# Altium footprint library Generic Module.PcbLib: 8 footprints
Each footprint in its own frame and in the unit in brackets; x right, y up, seen from the top. Pads: shape width x height; smd on the part's side, far side on the other; paste and mask are expansions set on the pad; w line width, h text height; cw(c..) or ccw(c..) is an arc to the next point about the centre after c.
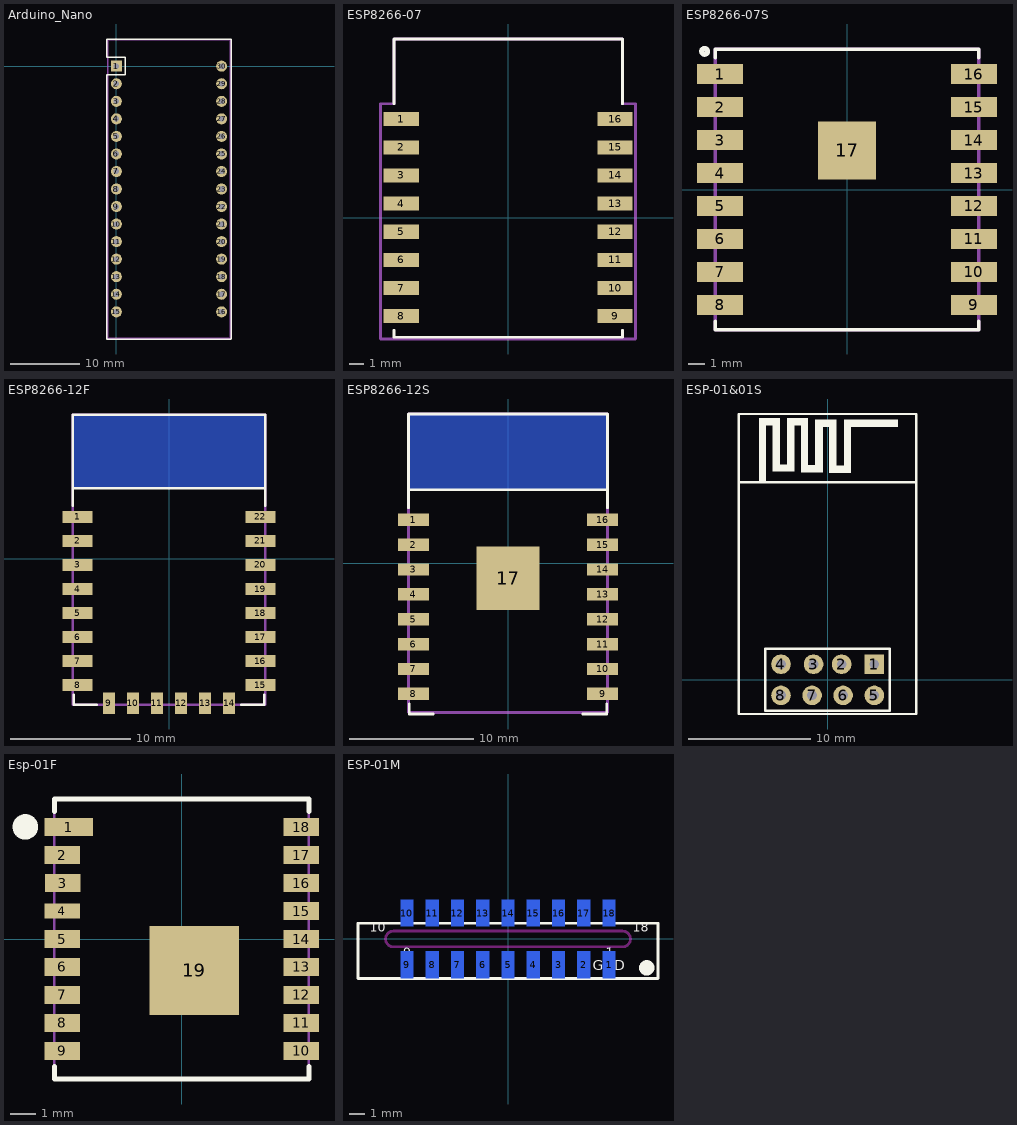
[diagram p0: the footprints below, top view; thin cyan lines are the x and y axes]

## Arduino_Nano [mm]
pads (30):
  rect 1.6x1.6 hole 0.8: 1(0,0)
  round 1.6 hole 0.8: 2(0,-2.54) 3(0,-5.08) 4(0,-7.62) 5(0,-10.16) 6(0,-12.7) 7(0,-15.24) 8(0,-17.78) 9(0,-20.32) 10(0,-22.86) 11(0,-25.4) 12(0,-27.94) 13(0,-30.48) 14(0,-33.02) 15(0,-35.56) 16(15.24,-35.56) 17(15.24,-33.02) 18(15.24,-30.48) 19(15.24,-27.94) 20(15.24,-25.4) 21(15.24,-22.86) 22(15.24,-20.32) 23(15.24,-17.78) 24(15.24,-15.24) 25(15.24,-12.7) 26(15.24,-10.16) 27(15.24,-7.62) 28(15.24,-5.08) 29(15.24,-2.54) 30(15.24,0)
Top Overlay:
  lines w0.2: -1.4,-39.5 -1.4,-1.27 1.27,-1.27 1.27,1.27 -1.4,1.27 -1.4,3.94 16.64,3.94 16.64,-39.5 -1.4,-39.5
Top Assembly:
  lines w0.2: -1.27,-39.37 16.51,-39.37 16.51,3.81 -1.27,3.81 -1.27,-39.37

## ESP8266-07 [mm]
pads (16):
  rect 2.5x1 smd: 1(-7.6,7) 2(-7.6,5) 3(-7.6,3) 4(-7.6,1) 5(-7.6,-1) 6(-7.6,-3) 7(-7.6,-5) 8(-7.6,-7) 9(7.6,-7) 10(7.6,-5) 11(7.6,-3) 12(7.6,-1) 13(7.6,1) 14(7.6,3) 15(7.6,5) 16(7.6,7)
Top Overlay:
  lines w0.203: -8.12,-8.001 -8.12,-8.5 8.12,-8.5 8.12,-8.001 ; -8.12,8.1 -8.12,12.7 8.12,12.7 8.12,8.1
Top Assembly:
  lines w0.203: -9.062,-8.62 -9.062,8.1 -8.12,8.1 -8.12,12.7 8.12,12.7 8.12,8.1 9.03,8.1 9.036,8.094 9.036,-8.62 -9.036,-8.62 -9.062,-8.593
Multi-Layer:
  pour cut-out: -8.128,12.641 -8.128,8.069 8.128,8.069 8.128,12.641
3D body "ESP8266-07.step": height 3.5, standoff -0.01, extent -7.96,-8.725 8.04,13.275

## ESP8266-07S [mm]
pads (17):
  rect 2.8x1.2 smd: 1(-7.7,7) 2(-7.7,5) 3(-7.7,3) 4(-7.7,1) 5(-7.7,-1) 6(-7.7,-3) 7(-7.7,-5) 8(-7.7,-7) 9(7.7,-7) 10(7.7,-5) 11(7.7,-3) 12(7.7,-1) 13(7.7,1) 14(7.7,3) 15(7.7,5) 16(7.7,7)
  rect 3.5x3.5 smd: 17(0,2.37)
Top Overlay:
  circle w0.3: c-8.636,8.382 r0.18
  lines w0.2: -8.001,8.001 -8.001,8.5 -8,8.5 8,8.5 ; -8,-8.5 8,-8.5 ; -7.999,-8.5 -7.999,-8.001 ; 7.999,8.001 7.999,8.5 ; 8.001,-8.5 8.001,-8.001
Top Assembly:
  lines w0.2: -8,-8.5 -8,8.5 8,8.5 8,-8.5 -8,-8.5
3D body: height 0.25, standoff 0, extent -8.001,-8.509 8.001,8.509

## ESP8266-12F [mm]
pads (22):
  rect 2.5x1 smd: 1(-7.6,3.5) 2(-7.6,1.5) 3(-7.6,-0.5) 4(-7.6,-2.5) 5(-7.6,-4.5) 6(-7.6,-6.5) 7(-7.6,-8.5) 8(-7.6,-10.5) 15(7.6,-10.5) 16(7.6,-8.5) 17(7.6,-6.5) 18(7.6,-4.5) 19(7.6,-2.5) 20(7.6,-0.5) 21(7.6,1.5) 22(7.6,3.5)
  rect 1x1.8 smd: 9(-5,-12) 10(-3,-12) 11(-1,-12) 12(1,-12) 13(3,-12) 14(5,-12)
Bottom Layer:
  pour cut-out: 8.001,12.065 8.001,5.842 -8.001,5.842 -8.001,12.065
Top Overlay:
  lines w0.2: -8.001,5.9 8.001,5.9
  lines w0.203: -8,4.445 -8,12 8,12 8,4.445 ; -7.925,-11.278 -7.925,-12.12 -6,-12.12 ; 6,-12.12 7.925,-12.12 7.925,-11.278
Top Assembly:
  lines w0.203: -8,-12.12 8,-12.12 8,12 -8,12 -8,-12.12
Multi-Layer:
  pour cut-out: 8.001,5.842 -8.001,5.842 -8.001,12.065 8.001,12.065
3D body "EPS8266-12E.step": height 2.65, standoff -0.04, extent -8.005,-12.065 8.005,11.94

## ESP8266-12S [mm]
pads (17):
  rect 2.5x1 smd: 1(-7.6,3.5) 2(-7.6,1.5) 3(-7.6,-0.5) 4(-7.6,-2.5) 5(-7.6,-4.5) 6(-7.6,-6.5) 7(-7.6,-8.5) 8(-7.6,-10.5) 9(7.6,-10.5) 10(7.6,-8.5) 11(7.6,-6.5) 12(7.6,-4.5) 13(7.6,-2.5) 14(7.6,-0.5) 15(7.6,1.5) 16(7.6,3.5)
  rect 5.08x5.08 smd: 17(0,-1.2)
Bottom Layer:
  pour cut-out: 8.001,11.938 8.001,5.842 -8.001,5.842 -8.001,11.938
  pour cut-out: -8.001,11.938
Top Overlay:
  lines w0.2: -8,5.9 8,5.9
  lines w0.203: -8,4.445 -8,12 8,12 8,4.445 ; -7.925,-11.278 -7.925,-12.12 -6,-12.12 ; 6,-12.12 7.925,-12.12 7.925,-11.278
Top Assembly:
  lines w0.203: -8,-12 8,-12 8,12 -8,12 -8,-12
Multi-Layer:
  pour cut-out: -8,12 -8,5.9 8,5.9 8,12
3D body "ESP-12S.step": height 2.35, standoff -0.77, extent -8,-12.06 8,11.94

## ESP-01&01S [mm]
pads (8):
  rect 1.6x1.6 hole 0.8: 1(3.81,1.27)
  round 1.6 hole 0.8: 2(1.15,1.27) 3(-1.15,1.27) 4(-3.81,1.27) 5(3.81,-1.27) 6(1.27,-1.27) 7(-1.27,-1.27) 8(-3.81,-1.27)
Top Overlay:
  rectangle: -5.599,16.129 -5.015,21.361
  rectangle: -5.015,20.777 -3.897,21.361
  rectangle: -4.507,17.018 -3.897,20.777
  rectangle: -3.897,17.018 -2.703,17.602
  rectangle: -3.313,17.602 -2.703,21.361
  rectangle: -2.703,20.777 -1.586,21.361
  rectangle: -2.17,16.942 -1.586,20.777
  rectangle: -1.586,16.942 -0.392,17.526
  rectangle: -1.027,17.526 -0.392,21.26
  rectangle: -0.392,20.65 0.726,21.26
  rectangle: 0.116,16.891 0.726,20.65
  rectangle: 0.726,16.891 1.919,17.501
  rectangle: 1.335,17.501 1.919,21.26
  rectangle: 1.919,20.65 5.755,21.26
  lines w0.2: -7.25,16.129 7.25,16.129 ; -7.25,-2.794 7.25,-2.794 7.25,21.706 -7.25,21.706 -7.25,-2.794 ; -5.08,-2.54 -5.08,2.54 5.08,2.54 5.08,-2.54 -5.08,-2.54
3D body "ESP-01.step": height 5.88, standoff -5.8, extent -7.239,-2.794 7.261,22.006

## Esp-01F [mm]
pads (19):
  rect 1.9x0.7 smd: 1(-4.441,4.4)
  rect 1.4x0.7 smd: 2(-4.695,3.3) 3(-4.67,2.2) 5(-4.695,0) 6(-4.695,-1.1) 7(-4.695,-2.2) 8(-4.695,-3.3) 9(-4.695,-4.4) 10(4.695,-4.4) 11(4.695,-3.3) 12(4.695,-2.2) 13(4.695,-1.1) 14(4.695,0) 15(4.695,1.1) 16(4.695,2.2) 17(4.695,3.3) 18(4.695,4.4)
  rect 1.4x0.6 smd: 4(-4.695,1.1)
  rect 3.5x3.5 smd: 19(0.493,-1.233)
Top Overlay:
  circle w0.5: c-6.143,4.406 r0.25
  lines w0.2: -5,-5.008 -5,-5.5 5,-5.5 5,-5.008 ; -5,5.008 -5,5.5 5,5.5 5,5.008
Mechanical 15:
  lines w0.1: -5,-5.5 5,-5.5 5,5.5 -5,5.5 -5,-5.5
3D body: height 0.25, standoff 0, extent -5.062,-5.588 5.08,5.589

## ESP-01M [mm]
pads (18):
  rect 0.8x1.7 smd far side: 1(6.4,-1.643) 2(4.8,-1.643) 3(3.2,-1.643) 4(1.6,-1.643) 5(0,-1.643) 6(-1.6,-1.643) 7(-3.2,-1.643) 8(-4.8,-1.643) 9(-6.4,-1.643) 10(-6.4,1.643) 11(-4.8,1.643) 12(-3.2,1.643) 13(-1.6,1.643) 14(0,1.643) 15(1.6,1.643) 16(3.2,1.643) 17(4.8,1.643) 18(6.4,1.643)
Top Overlay:
  circle w0.5: c8.788,-1.829 r0.234
  lines w0.178: -9.5,-2.5 -9.5,1 9.5,1 9.5,-2.5 -9.5,-2.5
  text "18" at 7.899,0.229 h1
  text "10" at -8.763,0.229 h1
  text "9" at -6.629,-1.346 h1
  text "1" at 6.198,-1.346 h1
  text "GND" at 5.359,-2.21 h1.1
Keep-Out Layer:
  lines w0.178: -7.75,-0.008 ccw(c-7.254,-0.004) -7.25,-0.5 7.25,-0.5 ccw(c7.254,-0.004) 7.75,-0.008 ; -7.75,0.008 cw(c-7.254,0.004) -7.25,0.5 7.25,0.5 cw(c7.254,0.004) 7.75,0.008